# Altium integrated library WE_WR-WTB_Wire to Board Connectors_2.00 mm_rev15c.IntLib: 70 symbols
Pins are listed as number, name and electrical type; pins without a type are passive.

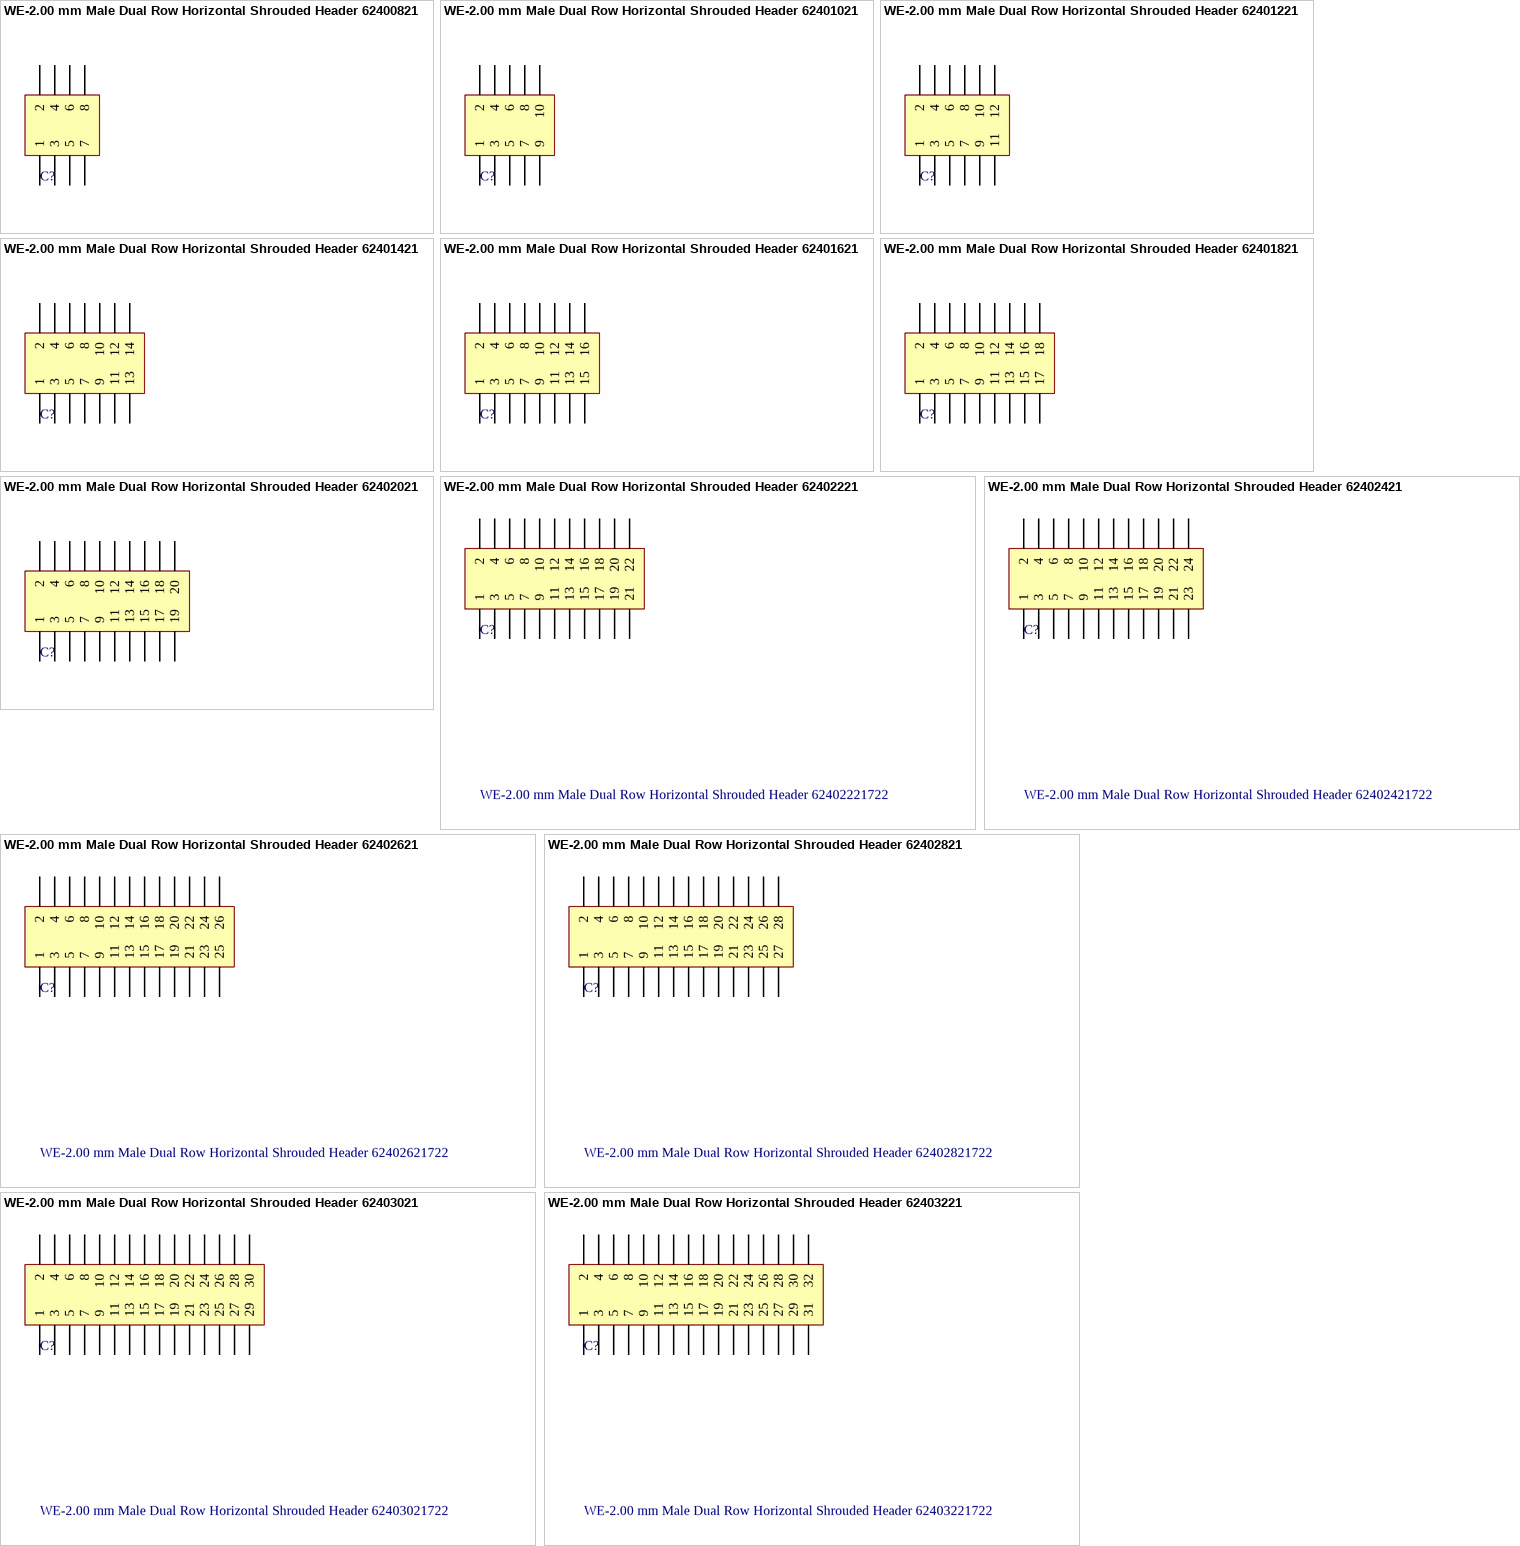
[diagram p0: symbols WE-2.00 mm Male Dual Row Horizontal Shrouded Header 62400821722 to WE-2.00 mm Male Dual Row Horizontal Shrouded Header 62403221722]

## WE-2.00 mm Male Dual Row Horizontal Shrouded Header 62400821722
designator C?
WR-WTB_2,00mm; Manufacturer: Würth Elektronik eiSos GmbH; ComponentLink1 Description: Manufacturer; ComponentLink2 Description: Datasheet; NoPins: 8; Created Date: 6 June 2013; partNo: 62400821722; ComponentLink1URL: http://www.we-online.com; ComponentLink2URL: http://katalog.we-online.de/em/datasheet/6240xx21722.pdf; Created by: Karrer Zheng
footprint 62400821722 (08 pins, Dual Rows, Rigth Angled, tin plating)
pins: 1, 2, 3, 4, 5, 6, 7, 8

## WE-2.00 mm Male Dual Row Horizontal Shrouded Header 62401021722
designator C?
WR-WTB_2,00mm; Manufacturer: Würth Elektronik eiSos GmbH; ComponentLink1 Description: Manufacturer; ComponentLink2 Description: Datasheet; NoPins: 10; Created Date: 6 June 2013; partNo: 62401021722; ComponentLink1URL: http://www.we-online.com; ComponentLink2URL: http://katalog.we-online.de/em/datasheet/6240xx21722.pdf; Created by: Karrer Zheng
footprint 62401021722 (10 pins, Dual Rows, Rigth Angled, tin plating)
pins: 1, 2, 3, 4, 5, 6, 7, 8, 9, 10

## WE-2.00 mm Male Dual Row Horizontal Shrouded Header 62401221722
designator C?
WR-WTB_2,00mm; Manufacturer: Würth Elektronik eiSos GmbH; ComponentLink1 Description: Manufacturer; ComponentLink2 Description: Datasheet; NoPins: 12; Created Date: 6 June 2013; partNo: 62401221722; ComponentLink1URL: http://www.we-online.com; ComponentLink2URL: http://katalog.we-online.de/em/datasheet/6240xx21722.pdf; Created by: Karrer Zheng
footprint 62401221722 (12 pins, Dual Rows, Rigth Angled, tin plating)
pins: 1, 2, 3, 4, 5, 6, 7, 8, 9, 10, 11, 12

## WE-2.00 mm Male Dual Row Horizontal Shrouded Header 62401421722
designator C?
WR-WTB_2,00mm; Manufacturer: Würth Elektronik eiSos GmbH; ComponentLink1 Description: Manufacturer; ComponentLink2 Description: Datasheet; NoPins: 14; Created Date: 6 June 2013; partNo: 62401421722; ComponentLink1URL: http://www.we-online.com; ComponentLink2URL: http://katalog.we-online.de/em/datasheet/6240xx21722.pdf; Created by: Karrer Zheng
footprint 62401421722 (14 pins, Dual Rows, Rigth Angled, tin plating)
pins: 1, 2, 3, 4, 5, 6, 7, 8, 9, 10, 11, 12, 13, 14

## WE-2.00 mm Male Dual Row Horizontal Shrouded Header 62401621722
designator C?
WR-WTB_2,00mm; Manufacturer: Würth Elektronik eiSos GmbH; ComponentLink1 Description: Manufacturer; ComponentLink2 Description: Datasheet; NoPins: 16; Created Date: 6 June 2013; partNo: 62401621722; ComponentLink1URL: http://www.we-online.com; ComponentLink2URL: http://katalog.we-online.de/em/datasheet/6240xx21722.pdf; Created by: Karrer Zheng
footprint 62401621722 (16 pins, Dual Rows, Rigth Angled, tin plating)
pins: 1, 2, 3, 4, 5, 6, 7, 8, 9, 10, 11, 12, 13, 14, 15, 16

## WE-2.00 mm Male Dual Row Horizontal Shrouded Header 62401821722
designator C?
WR-WTB_2,00mm; Manufacturer: Würth Elektronik eiSos GmbH; ComponentLink1 Description: Manufacturer; ComponentLink2 Description: Datasheet; NoPins: 18; Created Date: 6 June 2013; partNo: 62401821722; ComponentLink1URL: http://www.we-online.com; ComponentLink2URL: http://katalog.we-online.de/em/datasheet/6240xx21722.pdf; Created by: Karrer Zheng
footprint 62401821722 (18 pins, Dual Rows, Rigth Angled, tin plating)
pins: 1, 2, 3, 4, 5, 6, 7, 8, 9, 10, 11, 12, 13, 14, 15, 16, 17, 18

## WE-2.00 mm Male Dual Row Horizontal Shrouded Header 62402021722
designator C?
WR-WTB_2,00mm; Manufacturer: Würth Elektronik eiSos GmbH; ComponentLink1 Description: Manufacturer; ComponentLink2 Description: Datasheet; NoPins: 20; Created Date: 6 June 2013; partNo: 62402021722; ComponentLink1URL: http://www.we-online.com; ComponentLink2URL: http://katalog.we-online.de/em/datasheet/6240xx21722.pdf; Created by: Karrer Zheng
footprint 62402021722 (20 pins, Dual Rows, Rigth Angled, tin plating)
pins: 1, 2, 3, 4, 5, 6, 7, 8, 9, 10, 11, 12, 13, 14, 15, 16, 17, 18, 19, 20

## WE-2.00 mm Male Dual Row Horizontal Shrouded Header 62402221722
designator C?
WR-WTB_2,00mm; Manufacturer: Würth Elektronik eiSos GmbH; ComponentLink1 Description: Manufacturer; ComponentLink2 Description: Datasheet; NoPins: 22; Created Date: 6 June 2013; partNo: 62402221722; ComponentLink1URL: http://www.we-online.com; ComponentLink2URL: http://katalog.we-online.de/em/datasheet/6240xx21722.pdf; Created by: Karrer Zheng
footprint 62402221722 (22 pins, Dual Rows, Rigth Angled, tin plating)
pins: 1, 2, 3, 4, 5, 6, 7, 8, 9, 10, 11, 12, 13, 14, 15, 16, 17, 18, 19, 20, 21, 22

## WE-2.00 mm Male Dual Row Horizontal Shrouded Header 62402421722
designator C?
WR-WTB_2,00mm; Manufacturer: Würth Elektronik eiSos GmbH; ComponentLink1 Description: Manufacturer; ComponentLink2 Description: Datasheet; NoPins: 24; Created Date: 6 June 2013; partNo: 62402421722; ComponentLink1URL: http://www.we-online.com; ComponentLink2URL: http://katalog.we-online.de/em/datasheet/6240xx21722.pdf; Created by: Karrer Zheng
footprint 62402421722 (24 pins, Dual Rows, Rigth Angled, tin plating)
pins: 1, 2, 3, 4, 5, 6, 7, 8, 9, 10, 11, 12, 13, 14, 15, 16, 17, 18, 19, 20, 21, 22, 23, 24

## WE-2.00 mm Male Dual Row Horizontal Shrouded Header 62402621722
designator C?
WR-WTB_2,00mm; Manufacturer: Würth Elektronik eiSos GmbH; ComponentLink1 Description: Manufacturer; ComponentLink2 Description: Datasheet; NoPins: 26; Created Date: 6 June 2013; partNo: 62402621722; ComponentLink1URL: http://www.we-online.com; ComponentLink2URL: http://katalog.we-online.de/em/datasheet/6240xx21722.pdf; Created by: Karrer Zheng
footprint 62402621722 (26 pins, Dual Rows, Rigth Angled, tin plating)
pins: 1, 2, 3, 4, 5, 6, 7, 8, 9, 10, 11, 12, 13, 14, 15, 16, 17, 18, 19, 20, 21, 22, 23, 24, 25, 26

## WE-2.00 mm Male Dual Row Horizontal Shrouded Header 62402821722
designator C?
WR-WTB_2,00mm; Manufacturer: Würth Elektronik eiSos GmbH; ComponentLink1 Description: Manufacturer; ComponentLink2 Description: Datasheet; NoPins: 28; Created Date: 6 June 2013; partNo: 62402821722; ComponentLink1URL: http://www.we-online.com; ComponentLink2URL: http://katalog.we-online.de/em/datasheet/6240xx21722.pdf; Created by: Karrer Zheng
footprint 62402821722 (28 pins, Dual Rows, Rigth Angled, tin plating)
pins: 1, 2, 3, 4, 5, 6, 7, 8, 9, 10, 11, 12, 13, 14, 15, 16, 17, 18, 19, 20, 21, 22, 23, 24, 25, 26, 27, 28

## WE-2.00 mm Male Dual Row Horizontal Shrouded Header 62403021722
designator C?
WR-WTB_2,00mm; Manufacturer: Würth Elektronik eiSos GmbH; ComponentLink1 Description: Manufacturer; ComponentLink2 Description: Datasheet; NoPins: 30; Created Date: 6 June 2013; partNo: 62403021722; ComponentLink1URL: http://www.we-online.com; ComponentLink2URL: http://katalog.we-online.de/em/datasheet/6240xx21722.pdf; Created by: Karrer Zheng
footprint 62403021722 (30 pins, Dual Rows, Rigth Angled, tin plating)
pins: 1, 2, 3, 4, 5, 6, 7, 8, 9, 10, 11, 12, 13, 14, 15, 16, 17, 18, 19, 20, 21, 22, 23, 24, 25, 26, 27, 28, 29, 30

## WE-2.00 mm Male Dual Row Horizontal Shrouded Header 62403221722
designator C?
WR-WTB_2,00mm; Manufacturer: Würth Elektronik eiSos GmbH; ComponentLink1 Description: Manufacturer; ComponentLink2 Description: Datasheet; NoPins: 32; Created Date: 6 June 2013; partNo: 62403221722; ComponentLink1URL: http://www.we-online.com; ComponentLink2URL: http://katalog.we-online.de/em/datasheet/6240xx21722.pdf; Created by: Karrer Zheng
footprint 62403221722 (32 pins, Dual Rows, Rigth Angled, tin plating)
pins: 1, 2, 3, 4, 5, 6, 7, 8, 9, 10, 11, 12, 13, 14, 15, 16, 17, 18, 19, 20, 21, 22, 23, 24, 25, 26, 27, 28, 29, 30, 31, 32

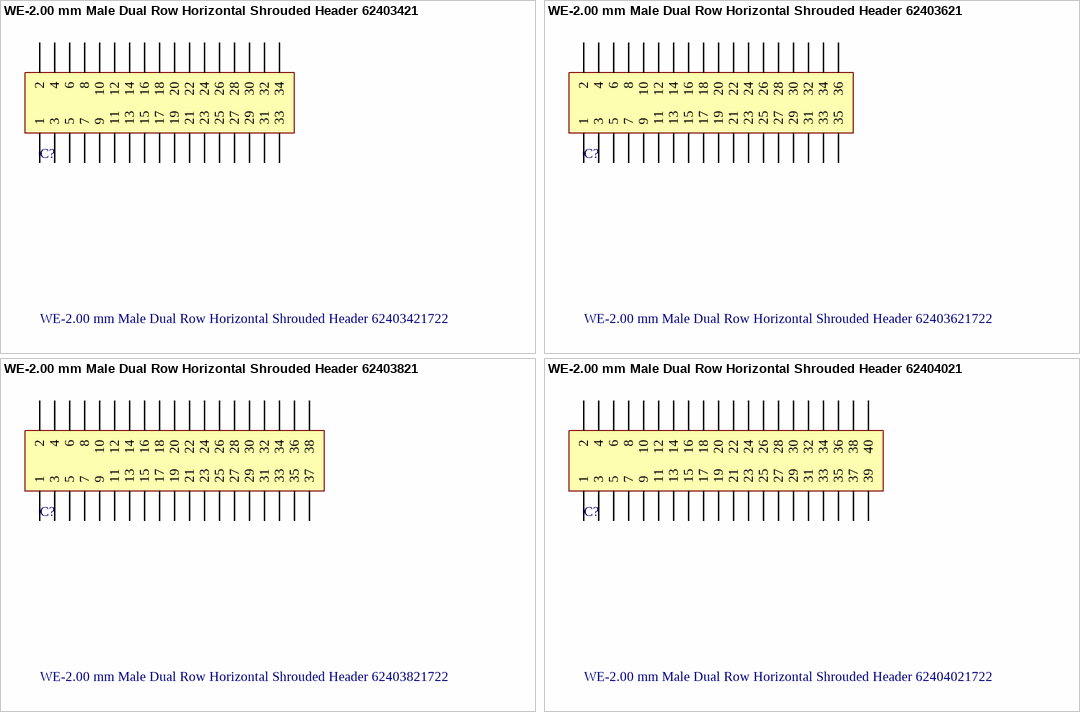
[diagram p1: symbols WE-2.00 mm Male Dual Row Horizontal Shrouded Header 62403421722 to WE-2.00 mm Male Dual Row Horizontal Shrouded Header 62404021722]

## WE-2.00 mm Male Dual Row Horizontal Shrouded Header 62403421722
designator C?
WR-WTB_2,00mm; Manufacturer: Würth Elektronik eiSos GmbH; ComponentLink1 Description: Manufacturer; ComponentLink2 Description: Datasheet; NoPins: 34; Created Date: 6 June 2013; partNo: 62403421722; ComponentLink1URL: http://www.we-online.com; ComponentLink2URL: http://katalog.we-online.de/em/datasheet/6240xx21722.pdf; Created by: Karrer Zheng
footprint 62403421722 (34 pins, Dual Rows, Rigth Angled, tin plating)
pins: 1, 2, 3, 4, 5, 6, 7, 8, 9, 10, 11, 12, 13, 14, 15, 16, 17, 18, 19, 20, 21, 22, 23, 24, 25, 26, 27, 28, 29, 30, 31, 32, 33, 34

## WE-2.00 mm Male Dual Row Horizontal Shrouded Header 62403621722
designator C?
WR-WTB_2,00mm; Manufacturer: Würth Elektronik eiSos GmbH; ComponentLink1 Description: Manufacturer; ComponentLink2 Description: Datasheet; NoPins: 36; Created Date: 6 June 2013; partNo: 62403621722; ComponentLink1URL: http://www.we-online.com; ComponentLink2URL: http://katalog.we-online.de/em/datasheet/6240xx21722.pdf; Created by: Karrer Zheng
footprint 62403621722 (36 pins, Dual Rows, Rigth Angled, tin plating)
pins: 1, 2, 3, 4, 5, 6, 7, 8, 9, 10, 11, 12, 13, 14, 15, 16, 17, 18, 19, 20, 21, 22, 23, 24, 25, 26, 27, 28, 29, 30, 31, 32, 33, 34, 35, 36

## WE-2.00 mm Male Dual Row Horizontal Shrouded Header 62403821722
designator C?
WR-WTB_2,00mm; Manufacturer: Würth Elektronik eiSos GmbH; ComponentLink1 Description: Manufacturer; ComponentLink2 Description: Datasheet; NoPins: 38; Created Date: 6 June 2013; partNo: 62403821722; ComponentLink1URL: http://www.we-online.com; ComponentLink2URL: http://katalog.we-online.de/em/datasheet/6240xx21722.pdf; Created by: Karrer Zheng
footprint 62403821722 (38 pins, Dual Rows, Rigth Angled, tin plating)
pins: 1, 2, 3, 4, 5, 6, 7, 8, 9, 10, 11, 12, 13, 14, 15, 16, 17, 18, 19, 20, 21, 22, 23, 24, 25, 26, 27, 28, 29, 30, 31, 32, 33, 34, 35, 36, 37, 38

## WE-2.00 mm Male Dual Row Horizontal Shrouded Header 62404021722
designator C?
WR-WTB_2,00mm; Manufacturer: Würth Elektronik eiSos GmbH; ComponentLink1 Description: Manufacturer; ComponentLink2 Description: Datasheet; NoPins: 40; Created Date: 6 June 2013; partNo: 62404021722; ComponentLink1URL: http://www.we-online.com; ComponentLink2URL: http://katalog.we-online.de/em/datasheet/6240xx21722.pdf; Created by: Karrer Zheng
footprint 62404021722 (40 pins, Dual Rows, Rigth Angled, tin plating)
pins: 1, 2, 3, 4, 5, 6, 7, 8, 9, 10, 11, 12, 13, 14, 15, 16, 17, 18, 19, 20, 21, 22, 23, 24, 25, 26, 27, 28, 29, 30, 31, 32, 33, 34, 35, 36, 37, 38, 39, 40


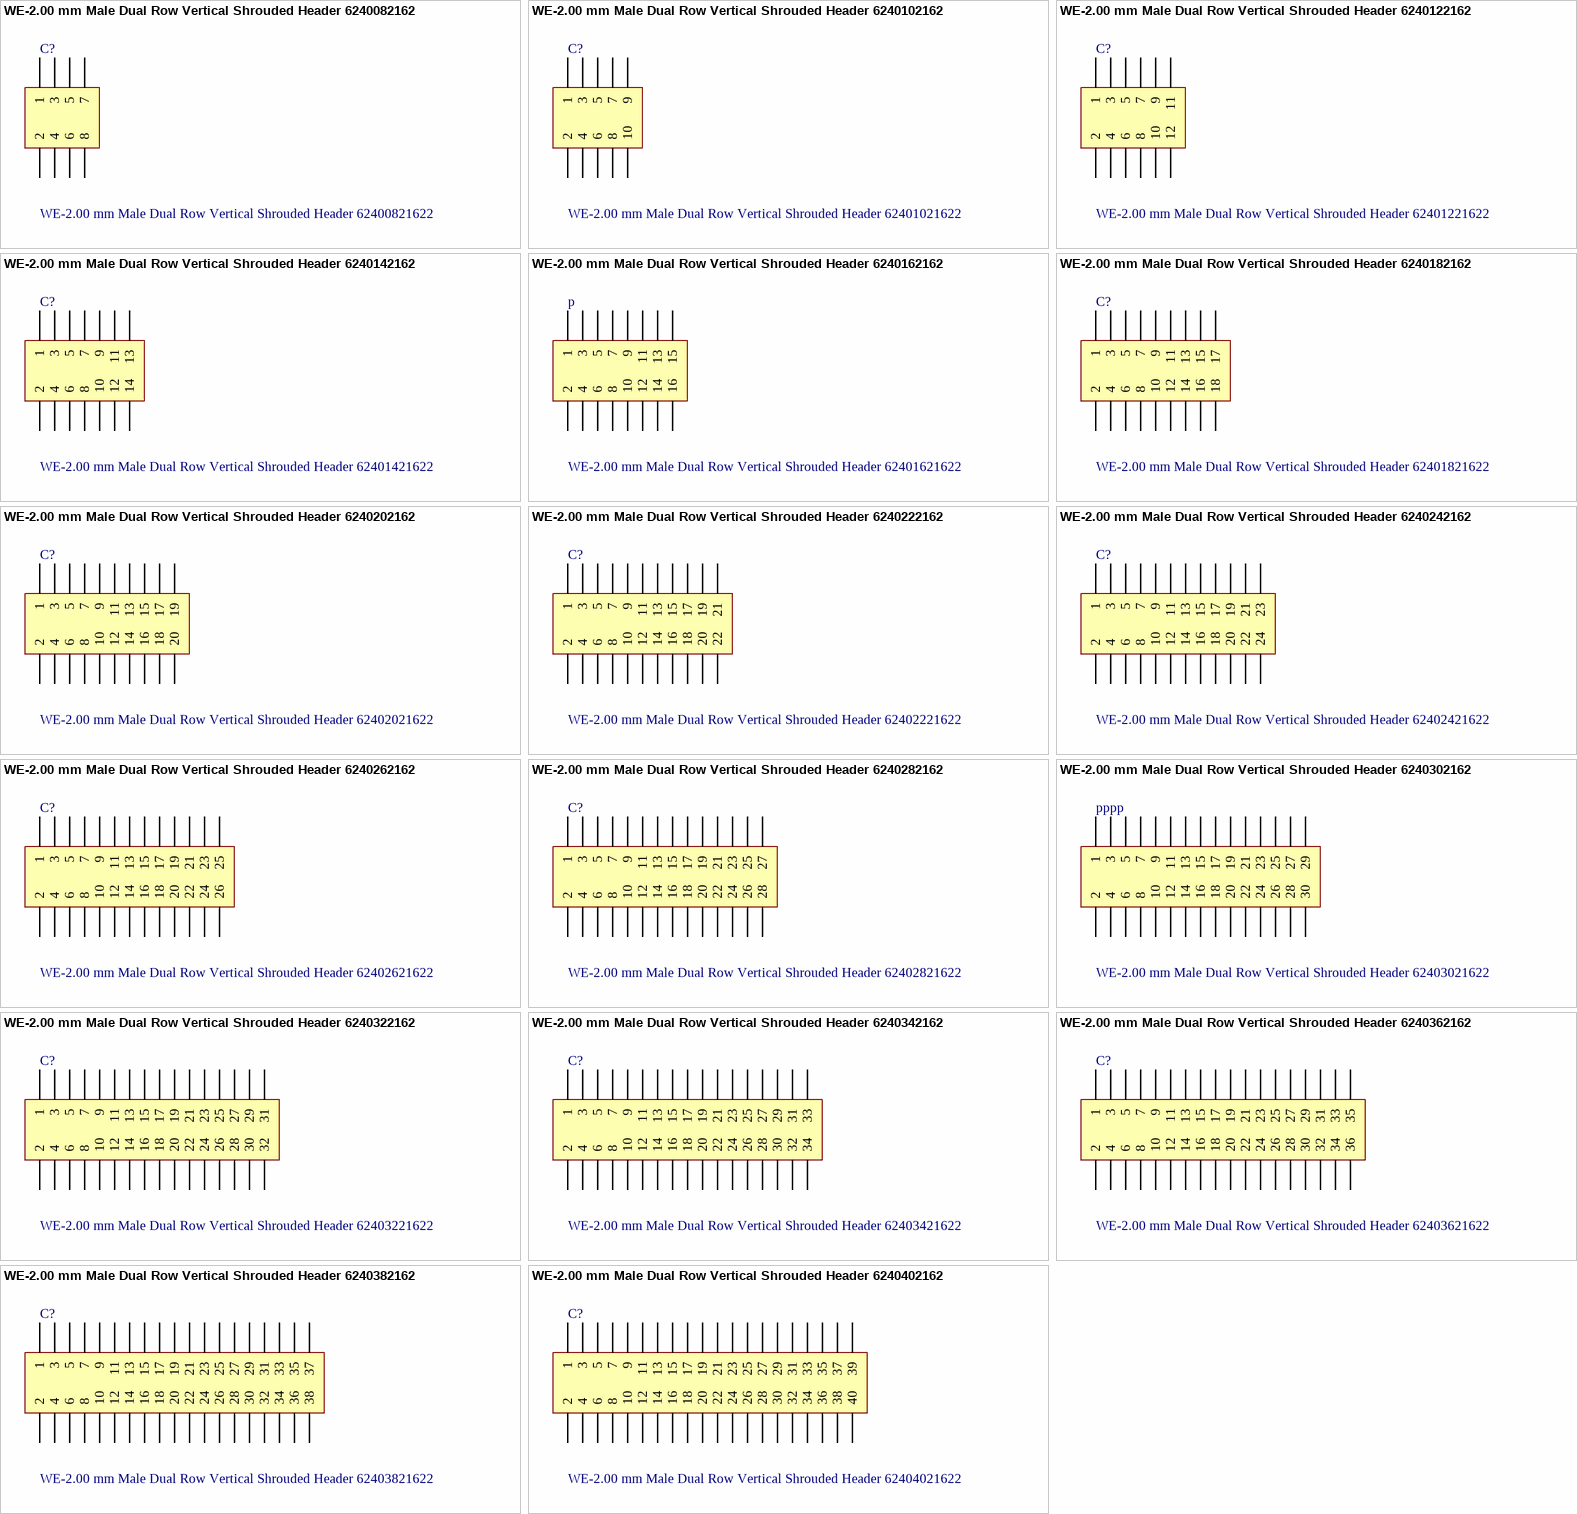
[diagram p2: symbols WE-2.00 mm Male Dual Row Vertical Shrouded Header 62400821622 to WE-2.00 mm Male Dual Row Vertical Shrouded Header 62404021622]

## WE-2.00 mm Male Dual Row Vertical Shrouded Header 62400821622
designator C?
WR-WTB_2,00mm; Manufacturer: Würth Elektronik eiSos GmbH; ComponentLink1 Description: Manufacturer; ComponentLink2 Description: Datasheet; NoPins: 8; Created Date: 6 June 2013; partNo: 62400821622; ComponentLink1URL: http://www.we-online.com; ComponentLink2URL: http://katalog.we-online.de/em/datasheet/6240xx21622.pdf; Created by: Karrer Zheng
footprint 62400821622 (08 pins, Dual Rows, Straight, tin plating)
pins: 1, 2, 3, 4, 5, 6, 7, 8

## WE-2.00 mm Male Dual Row Vertical Shrouded Header 62401021622
designator C?
WR-WTB_2,00mm; Manufacturer: Würth Elektronik eiSos GmbH; ComponentLink1 Description: Manufacturer; ComponentLink2 Description: Datasheet; NoPins: 10; Created Date: 6 June 2013; partNo: 62401021622; ComponentLink1URL: http://www.we-online.com; ComponentLink2URL: http://katalog.we-online.de/em/datasheet/6240xx21622.pdf; Created by: Karrer Zheng
footprint 62401021622 (10 pins, Dual Rows, Straight, tin plating)
pins: 1, 2, 3, 4, 5, 6, 7, 8, 9, 10

## WE-2.00 mm Male Dual Row Vertical Shrouded Header 62401221622
designator C?
WR-WTB_2,00mm; Manufacturer: Würth Elektronik eiSos GmbH; ComponentLink1 Description: Manufacturer; ComponentLink2 Description: Datasheet; NoPins: 12; Created Date: 6 June 2013; partNo: 62401221622; ComponentLink1URL: http://www.we-online.com; ComponentLink2URL: http://katalog.we-online.de/em/datasheet/6240xx21622.pdf; Created by: Karrer Zheng
footprint 62401221622 (12 pins, Dual Rows, Straight, tin plating)
pins: 1, 2, 3, 4, 5, 6, 7, 8, 9, 10, 11, 12

## WE-2.00 mm Male Dual Row Vertical Shrouded Header 62401421622
designator C?
WR-WTB_2,00mm; Manufacturer: Würth Elektronik eiSos GmbH; ComponentLink1 Description: Manufacturer; ComponentLink2 Description: Datasheet; NoPins: 14; Created Date: 6 June 2013; partNo: 62401421622; ComponentLink1URL: http://www.we-online.com; ComponentLink2URL: http://katalog.we-online.de/em/datasheet/6240xx21622.pdf; Created by: Karrer Zheng
footprint 62401421622 (14 pins, Dual Rows, Straight, tin plating)
pins: 1, 2, 3, 4, 5, 6, 7, 8, 9, 10, 11, 12, 13, 14

## WE-2.00 mm Male Dual Row Vertical Shrouded Header 62401621622
designator p
WR-WTB_2,00mm; Manufacturer: Würth Elektronik eiSos GmbH; ComponentLink1 Description: Manufacturer; ComponentLink2 Description: Datasheet; NoPins: 16; Created Date: 6 June 2013; partNo: 62401621622; ComponentLink1URL: http://www.we-online.com; ComponentLink2URL: http://katalog.we-online.de/em/datasheet/6240xx21622.pdf; Created by: Karrer Zheng
footprint 62401621622 (16 pins, Dual Rows, Straight, tin plating)
pins: 1, 2, 3, 4, 5, 6, 7, 8, 9, 10, 11, 12, 13, 14, 15, 16

## WE-2.00 mm Male Dual Row Vertical Shrouded Header 62401821622
designator C?
WR-WTB_2,00mm; Manufacturer: Würth Elektronik eiSos GmbH; ComponentLink1 Description: Manufacturer; ComponentLink2 Description: Datasheet; NoPins: 18; Created Date: 6 June 2013; partNo: 62401821622; ComponentLink1URL: http://www.we-online.com; ComponentLink2URL: http://katalog.we-online.de/em/datasheet/6240xx21622.pdf; Created by: Karrer Zheng
footprint 62401821622 (18 pins, Dual Rows, Straight, tin plating)
pins: 1, 2, 3, 4, 5, 6, 7, 8, 9, 10, 11, 12, 13, 14, 15, 16, 17, 18

## WE-2.00 mm Male Dual Row Vertical Shrouded Header 62402021622
designator C?
WR-WTB_2,00mm; Manufacturer: Würth Elektronik eiSos GmbH; ComponentLink1 Description: Manufacturer; ComponentLink2 Description: Datasheet; NoPins: 20; Created Date: 6 June 2013; partNo: 62402021622; ComponentLink1URL: http://www.we-online.com; ComponentLink2URL: http://katalog.we-online.de/em/datasheet/6240xx21622.pdf; Created by: Karrer Zheng
footprint 62402021622 (20 pins, Dual Rows, Straight, tin plating)
pins: 1, 2, 3, 4, 5, 6, 7, 8, 9, 10, 11, 12, 13, 14, 15, 16, 17, 18, 19, 20

## WE-2.00 mm Male Dual Row Vertical Shrouded Header 62402221622
designator C?
WR-WTB_2,00mm; Manufacturer: Würth Elektronik eiSos GmbH; ComponentLink1 Description: Manufacturer; ComponentLink2 Description: Datasheet; NoPins: 22; Created Date: 6 June 2013; partNo: 62402221622; ComponentLink1URL: http://www.we-online.com; ComponentLink2URL: http://katalog.we-online.de/em/datasheet/6240xx21622.pdf; Created by: Karrer Zheng
footprint 62402221622 (22 pins, Dual Rows, Straight, tin plating)
pins: 1, 2, 3, 4, 5, 6, 7, 8, 9, 10, 11, 12, 13, 14, 15, 16, 17, 18, 19, 20, 21, 22

## WE-2.00 mm Male Dual Row Vertical Shrouded Header 62402421622
designator C?
WR-WTB_2,00mm; Manufacturer: Würth Elektronik eiSos GmbH; ComponentLink1 Description: Manufacturer; ComponentLink2 Description: Datasheet; NoPins: 24; Created Date: 6 June 2013; partNo: 62402421622; ComponentLink1URL: http://www.we-online.com; ComponentLink2URL: http://katalog.we-online.de/em/datasheet/6240xx21622.pdf; Created by: Karrer Zheng
footprint 62402421622 (24 pins, Dual Rows, Straight, tin plating)
pins: 1, 2, 3, 4, 5, 6, 7, 8, 9, 10, 11, 12, 13, 14, 15, 16, 17, 18, 19, 20, 21, 22, 23, 24
